# Altium footprint library Austindetz_CM4_Board_v1.0.PcbLib: 102 footprints (part 1 of 7)
Each footprint in its own frame and in the unit in brackets; x right, y up, seen from the top. Pads: shape width x height; smd on the part's side, far side on the other; paste and mask are expansions set on the pad; w line width, h text height; cw(c..) or ccw(c..) is an arc to the next point about the centre after c.
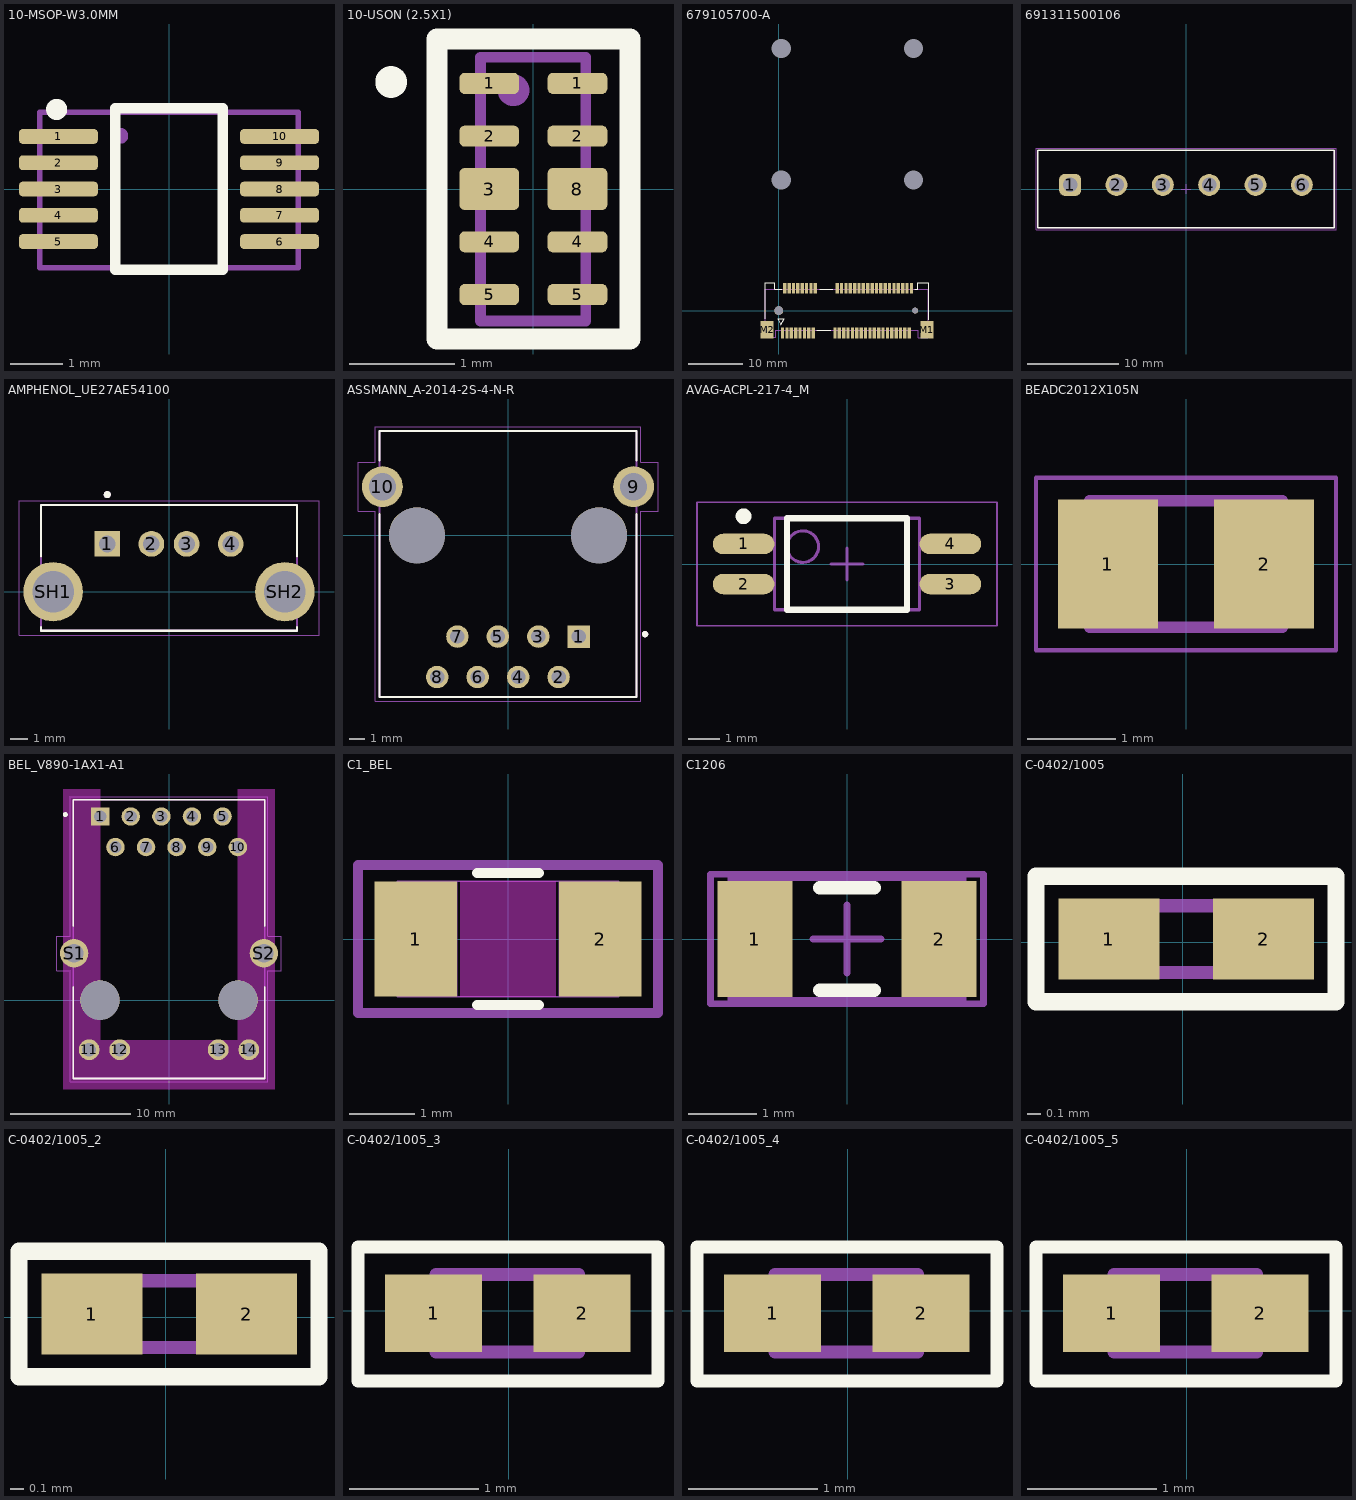
[diagram p0: the footprints below, top view; thin cyan lines are the x and y axes]

## 10-MSOP-W3.0MM [mm]
pads (10):
  rrect50% 1.5x0.28 smd: 1(-2.105,1) 2(-2.105,0.5) 3(-2.105,0) 4(-2.105,-0.5) 5(-2.105,-1) 6(2.105,-1) 7(2.105,-0.5) 8(2.105,0) 9(2.105,0.5) 10(2.105,1)
Top Overlay:
  circle w0.2: c-2.138,1.515 r0.1
  lines w0.2: -1.022,-1.532 1.022,-1.532 1.022,1.459 1.022,1.532 -1.022,1.532 -1.022,-1.532
Top Assembly:
  circle w0.2: c-0.926,1.012 r0.05
  lines w0.1: -1.077,1.459 1.022,1.459 ; -2.461,-1.498 -2.461,1.459 -1.714,1.459 2.462,1.459 2.462,-1.498 -2.461,-1.498
  text "'.Designator'" at 0.688,0.093 h1.27
3D body "msop-10.STEP": height 1.15, standoff 0, extent -2.45,-1.5 2.45,1.5

## 10-USON (2.5X1) [mm]
pads (10):
  rrect50% 0.565x0.2 smd mask+0: 1(-0.417,1) 1(0.417,1) 2(-0.417,0.5) 2(0.417,0.5) 4(-0.417,-0.5) 4(0.417,-0.5) 5(-0.417,-1) 5(0.417,-1)
  rrect25% 0.565x0.4 smd paste-1 mask+0: 3(-0.417,0) 8(0.417,0)
Top Overlay:
  circle w0.2: c-1.346,1.013 r0.05
  lines w0.2: -0.913,-1.42 -0.913,1.42 -0.5,1.42 0.5,1.42 0.916,1.42 0.916,-1.42 0.5,-1.42 -0.5,-1.42 -0.913,-1.42
Top Paste:
  drawing of 2 lines, arcs and shapes, not listed
Top Solder:
  region: -0.065,0.83 -0.77,0.83 -0.77,1.17 -0.065,1.17
  region: -0.065,0.33 -0.77,0.33 -0.77,0.67 -0.065,0.67
  region: -0.065,-0.67 -0.77,-0.67 -0.77,-0.33 -0.065,-0.33
  region: -0.065,-1.17 -0.77,-1.17 -0.77,-0.83 -0.065,-0.83
  region: 0.77,0.83 0.065,0.83 0.065,1.17 0.77,1.17
  region: 0.77,0.33 0.065,0.33 0.065,0.67 0.77,0.67
  region: 0.77,-0.67 0.065,-0.67 0.065,-0.33 0.77,-0.33
  region: 0.77,-1.17 0.065,-1.17 0.065,-0.83 0.77,-0.83
  region: -0.065,-0.27 -0.77,-0.27 -0.77,0.27 -0.065,0.27
  region: 0.77,-0.27 0.065,-0.27 0.065,0.27 0.77,0.27
Top Assembly:
  circle w0.2: c-0.188,0.935 r0.05
  lines w0.1: -0.5,-1.249 -0.5,1.247 -0.131,1.247 0.498,1.247 0.498,-1.249 -0.5,-1.249
  text "'.Designator'" at -1.653,0.569 h1.27
3D body "TPD4EUSB30DQAR.STEP": height 0.55, standoff 0, extent -0.5,-1.25 0.5,1.25

## 679105700-A [mm]
height 1.6
pads (60):
  rect 0.6x2 smd paste-2 mask+0: 1(0.7,-4.1) 2(1.1,4.1) 3(1.5,-4.1) 4(1.9,4.1) 5(2.3,-4.1) 6(2.7,4.1) 7(3.1,-4.1) 8(3.5,4.1) 9(3.9,-4.1) 10(4.3,4.1) 11(4.7,-4.1) 12(5.1,4.1) 13(5.5,-4.1) 14(5.9,4.1) 15(6.3,-4.1) 16(6.7,4.1) 17(10.3,-4.1) 18(10.7,4.1) 19(11.1,-4.1) 20(11.5,4.1) 21(11.9,-4.1) 22(12.3,4.1) 23(12.7,-4.1) 24(13.1,4.1) 25(13.5,-4.1) 26(13.9,4.1) 27(14.3,-4.1) 28(14.7,4.1) 29(15.1,-4.1) 30(15.5,4.1) 31(15.9,-4.1) 32(16.3,4.1) 33(16.7,-4.1) 34(17.1,4.1) 35(17.5,-4.1) 36(17.9,4.1) 37(18.3,-4.1) 38(18.7,4.1) 39(19.1,-4.1) 40(19.5,4.1) 41(19.9,-4.1) 42(20.3,4.1) 43(20.7,-4.1) 44(21.1,4.1) 45(21.5,-4.1) 46(21.9,4.1) 47(22.3,-4.1) 48(22.7,4.1) 49(23.1,-4.1) 50(23.5,4.1) 51(23.9,-4.1) 52(24.3,4.1)
  rect 2.3x3.2 smd paste-0.1 mask+0: M1(27.15,-3.5) M2(-2.15,-3.5)
  round 1.6 hole 1.6 unplated: ""(0,0)
  round 1.6 hole 3.5 unplated: ""(0.45,23.9) ""(0.45,48)
  round 1.1 hole 3.5 unplated: ""(24.65,23.9) ""(24.65,48)
  round 1.1 hole 1.1 unplated: ""(25,0)
Top Overlay:
  lines w0.102: -0.19,-1.518 1.03,-1.518 0.406,-2.547 -0.19,-1.518
  lines w0.127: -2.438,-1.479 -2.438,5.08 -0.762,5.08 -0.762,3.937 0.508,3.937 ; 6.985,-3.556 9.525,-3.556 ; 7.493,3.937 9.906,3.937 ; 24.892,3.93 25.478,3.93 25.478,5.08 25.654,5.08 27.432,5.08 27.432,-1.651
Top Paste:
  drawing of 52 lines, arcs and shapes, not listed
Top Solder:
  drawing of 54 lines, arcs and shapes, not listed
Mechanical 13:
  lines w0.102: -2.439,3.937 -2.439,-4.905 -0.542,-4.905 ; -2.385,3.929 27.371,3.929 ; -0.081,-3.577 25.04,-3.577 ; 25.528,-4.932 27.425,-4.932 27.425,3.937
  lines w0.127: -0.542,-4.905 -0.542,-3.577 -0.081,-3.577 ; 25.04,-3.577 25.528,-3.577 25.528,-4.932
3D body "67910-5700--3DModel-STEP-1.STEP": height 5.76, standoff -0.74, extent -2.532,-5.1 27.468,5.1

## 691311500106 [mm] "5,08mm - PCB Headers - Vertical - Closed ends -06p"
height 12
pads (6):
  rrect50% 2.4x2.4 hole 1.6: 1(-12.7,0.45)
  round 2.4 hole 1.6: 2(-7.62,0.45) 3(-2.54,0.45) 4(2.54,0.45) 5(7.62,0.45) 6(12.7,0.45)
Top Overlay:
  lines w0.2: -16.24,-4.25 -16.24,4.25 16.24,4.25 16.24,-4.25 -16.24,-4.25
Top 3D Body:
  lines w0.1: -16.24,-4.25 -16.24,4.25 16.24,4.25 16.24,-4.25 -16.24,-4.25
Top Component Outline:
  lines w0.1: -16.24,-4.25 16.24,-4.25 16.24,4.25 -16.24,4.25 -16.24,-4.25
Top Courtyard:
  lines w0.05: -16.44,-4.45 -16.44,4.45 16.44,4.45 16.44,-4.45 -16.44,-4.45
Top Designator:
  text ".Designator" at -7.498,-0.5 h1.5
Top Component Center:
  lines w0.05: -0.5,0 0.5,0 ; 0,-0.5 0,0.5
3D body "691311500106.stp": height 12.05, standoff -3.95, extent -16.24,-4.25 16.24,4.25

## AMPHENOL_UE27AE54100 [mm]
height 14
pads (6):
  rect 1.458x1.458 hole 0.95: 1(-3.5,2.71)
  round 1.458 hole 0.95: 2(-1,2.71) 3(1,2.71) 4(3.5,2.71)
  round 3.366 hole 2.35: SH1(-6.57,0) SH2(6.57,0)
Top Overlay:
  circle w0.2: c-3.5,5.5 r0.1
  lines w0.127: -7.25,-2.003 -7.25,-2.21 7.25,-2.21 7.25,-2.003 ; -7.25,2.003 -7.25,4.91 7.25,4.91 7.25,2.003
Mechanical 13:
  circle w0.2: c-3.5,5.5 r0.1
  lines w0.127: -7.25,-2.21 7.25,-2.21 7.25,4.91 -7.25,4.91 -7.25,-2.21
Mechanical 15:
  lines w0.05: -8.503,-2.46 -8.503,5.16 8.503,5.16 8.503,-2.46 -8.503,-2.46
3D body "UE27AE54100.step": height 14, standoff -4.33, extent -7.949,-2.2 7.949,4.92

## ASSMANN_A-2014-2S-4-N-R [mm]
pads (12):
  rect 1.408x1.408 hole 0.9: 1(4.445,-6.35)
  round 1.408 hole 0.9: 2(3.175,-8.89) 3(1.905,-6.35) 4(0.635,-8.89) 5(-0.635,-6.35) 6(-1.905,-8.89) 7(-3.175,-6.35) 8(-4.445,-8.89)
  round 2.565 hole 1.71: 9(7.875,3.05) 10(-7.875,3.05)
  round 3.51 hole 3.51 unplated: ""(-5.715,0) ""(5.715,0)
Top Overlay:
  circle w0.2: c8.6,-6.2 r0.1
  lines w0.127: -8.075,1.35 -8.075,-10.15 8.075,-10.15 8.075,1.35 ; -8.075,4.7 -8.075,6.55 8.075,6.55 8.075,4.7
Mechanical 13:
  circle w0.2: c8.6,-6.2 r0.1
  lines w0.127: -8.075,-10.15 -8.075,6.55 8.075,6.55 8.075,-10.15 -8.075,-10.15
Mechanical 15:
  lines w0.05: -9.41,1.52 -9.41,4.58 -8.325,4.58 -8.325,6.8 8.325,6.8 8.325,4.58 9.41,4.58 9.41,1.52 8.325,1.52 8.325,-10.4 -8.325,-10.4 -8.325,1.52 -9.41,1.52
3D body "A-2014-2S-4-N-R.step": height 16.47, standoff -3.48, extent -8.098,-10.136 8.052,6.564

## AVAG-ACPL-217-4_M [mm] "SOIC, 4-Leads, Body 4.6x2.9mm, Pitch 1.27mm, IPC Low Density"
height 2.344
pads (4):
  oval 1.95x0.65 smd: 1(-3.275,0.635) 2(-3.275,-0.635) 3(3.275,-0.635) 4(3.275,0.635)
Top Overlay:
  circle w0.25: c-3.275,1.51 r0.125
  lines w0.2: -1.9,-1.45 -1.9,1.45 1.9,1.45 1.9,-1.45 -1.9,-1.45
Mechanical 13:
  circle w0.1: c-1.4,0.55 r0.5
  lines w0.1: -2.3,-1.45 -2.3,1.45 2.3,1.45 2.3,-1.45 -2.3,-1.45
Mechanical 15:
  lines w0.05: -4.75,-1.95 -4.75,1.95 4.75,1.95 4.75,-1.95 -4.75,-1.95
  lines w0.1: -0.5,0 0.5,0 ; 0,-0.5 0,0.5
3D body "SOIC127P700X234-4N.step": height 2.34, standoff 0, extent -3.5,-1.45 3.5,1.45

## BEADC2012X105N [mm]
height 13.32
pads (2):
  rect 1.14x1.47 smd: 1(-0.89,0) 2(0.89,0)
Mechanical 13:
  lines w0.127: -1.1,-0.72 1.1,-0.72 1.1,0.72 -1.1,0.72 -1.1,-0.72
Mechanical 15:
  lines w0.05: -1.708,-0.983 1.708,-0.983 1.708,0.983 -1.708,0.983 -1.708,-0.983

## BEL_V890-1AX1-A1 [mm]
pads (18):
  rect 1.53x1.53 hole 1.02: 1(-5.715,15.24)
  round 1.53 hole 1.02: 2(-3.175,15.24) 3(-0.635,15.24) 4(1.905,15.24) 5(4.445,15.24) 6(-4.445,12.7) 7(-1.905,12.7) 8(0.635,12.7) 9(3.175,12.7) 10(5.715,12.7)
  round 1.725 hole 1.15: 11(-6.625,-4.11) 12(-4.085,-4.11) 13(4.085,-4.11) 14(6.625,-4.11)
  round 2.355 hole 1.57: S1(-7.875,3.89) S2(7.875,3.89)
  round 3.25 hole 3.25 unplated: ""(-5.715,0) ""(5.715,0)
Top Overlay:
  circle w0.2: c-8.6,15.4 r0.1
  lines w0.127: -7.95,1.12 -7.95,-6.5 7.95,-6.5 7.95,1.12 ; -7.95,6.124 -7.95,16.61 7.95,16.61 7.95,6.124
Keep-Out Layer:
  region: 8.765,-7.37 -8.765,-7.37 -8.765,17.52 -5.715,17.52 -5.715,-3.31 5.715,-3.31 5.715,17.52 8.765,17.52
  region: 8.765,-7.37 -8.765,-7.37 -8.765,17.52 -5.715,17.52 -5.715,-3.31 5.715,-3.31 5.715,17.52 8.765,17.52
Mechanical 13:
  circle w0.2: c-8.6,15.4 r0.1
  lines w0.127: -7.95,-6.5 7.95,-6.5 7.95,16.61 -7.95,16.61 -7.95,-6.5
Mechanical 15:
  lines w0.05: -9.3,2.46 -8.2,2.46 -8.2,-6.75 8.2,-6.75 8.2,2.46 9.3,2.46 9.3,5.32 8.2,5.32 8.2,16.86 -8.2,16.86 -8.2,5.32 -9.3,5.32 -9.3,2.46
3D body "V890-1AX1-A1.step": height 16.78, standoff -3.43, extent -8.103,-6.502 8.103,16.612

## C1_BEL [mil]
height 130.31
pads (2):
  rect 50x70 smd paste+0 mask+0: 1(-56,0) 2(56,0)
Top Layer keep-out:
  region: -29,-33 -29,33 29,33 29,-33
Top Overlay:
  lines w6: -18.89,-40 18.89,-40 ; -18.89,40 18.89,40
Keep-Out Layer:
  region: -29,-35 -29,35 29,35 29,-35
Mechanical 13:
  lines w1: -67,-35 -67,35 ; -67,-35 -31,-35 -31,35 -67,35 ; -67,-35 67,-35 ; -67,-35 -67,35 ; -67,35 67,35 ; 67,-35 31,-35 31,35 67,35 ; 67,-35 67,35 ; 67,-35 67,35
Mechanical 15:
  lines w6: -91,-45 -91,45 91,45 91,-45 -91,-45
3D body "C1_BEL.step": height 30.98, standoff 0, extent -67.01,-35 67.01,35

## C1206 [mm] "Chip Capacitor, Body 3.2x1.6mm, IPC High Density"
height 1.3
pads (2):
  rect 1.1x1.7 smd: 1(-1.35,0) 2(1.35,0)
Top Overlay:
  lines w0.2: -0.4,-0.75 0.4,-0.75 ; -0.4,0.75 0.4,0.75
Mechanical 13:
  lines w0.1: -1.7,-0.9 -1.7,0.9 1.7,0.9 1.7,-0.9 -1.7,-0.9
Mechanical 15:
  lines w0.1: -0.5,0 0.5,0 ; 0,-0.5 0,0.5 ; -2,-0.95 -2,0.95 2,0.95 2,-0.95 -2,-0.95
3D body: height 1.3, standoff 0, extent -1.7,-0.9 1.7,0.9

## C-0402/1005 [mm] "Chip Capacitor, 2-Leads, Body 1.02x0.51mm, IPC Medium Density"
height 0.52
pads (2):
  rect 0.75x0.6 smd: 1(-0.55,0.022) 2(0.6,0.022)
Top Overlay:
  lines w0.127: -1.09,-0.443 -1.09,0.489 1.137,0.489 1.137,-0.443 -1.09,-0.443
Top Assembly:
  lines w0.1: -0.478,-0.225 -0.478,0.271 0.524,0.271 0.524,-0.225 -0.478,-0.225
  text "'.Designator'" at -2.8,-1.6 h1.27
3D body "0402 cap.STEP": height 0.52, standoff 0, extent -0.483,-0.241 0.517,0.283

## C-0402/1005_2 [mm]
pads (2):
  rect 0.75x0.6 smd: 1(-0.55,0.022) 2(0.6,0.022)
Top Overlay:
  lines w0.127: -1.09,-0.443 1.137,-0.443 1.137,0.489 -1.09,0.489 -1.09,-0.443
Top Assembly:
  lines w0.1: -0.478,-0.225 0.524,-0.225 0.524,0.271 -0.478,0.271 -0.478,-0.225
  text "'.Designator'" at -2.8,-1.6 h1.27
3D body "0402 cap.STEP": height 0.52, standoff 0, extent -0.483,-0.241 0.517,0.283

## C-0402/1005_3 [mm]
pads (2):
  rect 0.75x0.6 smd: 1(-0.58,-0.02) 2(0.57,-0.02)
Top Overlay:
  lines w0.1: -1.166,-0.544 -1.166,0.492 1.158,0.492 1.158,-0.544 -1.166,-0.544
Top Assembly:
  lines w0.1: -0.563,-0.321 -0.563,0.281 0.544,0.281 0.544,-0.321 -0.563,-0.321
  text "'.Designator'" at 0.404,-2.655 h1.27
3D body "0402 cap.STEP": height 0.52, standoff 0, extent -0.51,-0.282 0.49,0.242

## C-0402/1005_4 [mm]
pads (2):
  rect 0.75x0.6 smd: 1(-0.58,-0.02) 2(0.57,-0.02)
Top Overlay:
  lines w0.1: -1.166,-0.544 -1.166,0.492 1.158,0.492 1.158,-0.544 -1.166,-0.544
Top Assembly:
  lines w0.1: -0.563,-0.321 -0.563,0.281 0.544,0.281 0.544,-0.321 -0.563,-0.321
  text "'.Designator'" at 0.404,-2.655 h1.27
3D body "0402 cap.STEP": height 0.52, standoff 0, extent -0.51,-0.282 0.49,0.242

## C-0402/1005_5 [mm]
pads (2):
  rect 0.75x0.6 smd: 1(-0.58,-0.02) 2(0.57,-0.02)
Top Overlay:
  lines w0.1: -1.166,-0.544 -1.166,0.492 1.158,0.492 1.158,-0.544 -1.166,-0.544
Top Assembly:
  lines w0.1: -0.563,-0.321 -0.563,0.281 0.544,0.281 0.544,-0.321 -0.563,-0.321
  text "'.Designator'" at 0.404,-2.655 h1.27
3D body "0402 cap.STEP": height 0.52, standoff 0, extent -0.51,-0.282 0.49,0.242